# Altium footprint library Connector_PinHeader_2.54mm.PcbLib: 278 footprints (part 10 of 18) (continued)
## PinHeader_1x38_P2.54mm_Vertical_SMD_Pin1Right [mm] (continued)
  text "'.Designator'" at 0.84,-4.047 h1

## PinHeader_1x39_P2.54mm_Horizontal [mm]
pads (39):
  rect 1.7x1.7 hole 1: 1(0,0)
  rrect100% 1.7x1.7 hole 1: 2(0,-2.54) 3(0,-5.08) 4(0,-7.62) 5(0,-10.16) 6(0,-12.7) 7(0,-15.24) 8(0,-17.78) 9(0,-20.32) 10(0,-22.86) 11(0,-25.4) 12(0,-27.94) 13(0,-30.48) 14(0,-33.02) 15(0,-35.56) 16(0,-38.1) 17(0,-40.64) 18(0,-43.18) 19(0,-45.72) 20(0,-48.26) 21(0,-50.8) 22(0,-53.34) 23(0,-55.88) 24(0,-58.42) 25(0,-60.96) 26(0,-63.5) 27(0,-66.04) 28(0,-68.58) 29(0,-71.12) 30(0,-73.66) 31(0,-76.2) 32(0,-78.74) 33(0,-81.28) 34(0,-83.82) 35(0,-86.36) 36(0,-88.9) 37(0,-91.44) 38(0,-93.98) 39(0,-96.52)
F.SilkS:
  drawing of 245 lines, arcs and shapes, not listed
F.CrtYd:
  lines w0.05: -1.8,-98.3 -1.8,1.8 10.55,1.8 10.55,-98.3 -1.8,-98.3
F.Fab:
  drawing of 239 lines, arcs and shapes, not listed
  text "'.Designator'" at 3.61,-52.307 h1

## PinHeader_1x39_P2.54mm_Vertical [mm]
pads (39):
  rect 1.7x1.7 hole 1: 1(0,0)
  rrect100% 1.7x1.7 hole 1: 2(0,-2.54) 3(0,-5.08) 4(0,-7.62) 5(0,-10.16) 6(0,-12.7) 7(0,-15.24) 8(0,-17.78) 9(0,-20.32) 10(0,-22.86) 11(0,-25.4) 12(0,-27.94) 13(0,-30.48) 14(0,-33.02) 15(0,-35.56) 16(0,-38.1) 17(0,-40.64) 18(0,-43.18) 19(0,-45.72) 20(0,-48.26) 21(0,-50.8) 22(0,-53.34) 23(0,-55.88) 24(0,-58.42) 25(0,-60.96) 26(0,-63.5) 27(0,-66.04) 28(0,-68.58) 29(0,-71.12) 30(0,-73.66) 31(0,-76.2) 32(0,-78.74) 33(0,-81.28) 34(0,-83.82) 35(0,-86.36) 36(0,-88.9) 37(0,-91.44) 38(0,-93.98) 39(0,-96.52)
F.SilkS:
  lines w0.12: -1.33,0 -1.33,1.33 0,1.33 ; -1.33,-97.85 -1.33,-1.27 1.33,-1.27 1.33,-97.85 -1.33,-97.85
F.CrtYd:
  lines w0.05: -1.8,-98.3 1.8,-98.3 1.8,1.8 -1.8,1.8 -1.8,-98.3
F.Fab:
  lines w0.1: -1.27,-97.79 1.27,-97.79 1.27,1.27 -0.635,1.27 -1.27,0.635 -1.27,-97.79
  text "'.Designator'" at 0.84,-52.307 h1

## PinHeader_1x39_P2.54mm_Vertical_SMD_Pin1Left [mm]
pads (39):
  rect 2.51x1 smd: 1(-1.655,48.26) 2(1.655,45.72) 3(-1.655,43.18) 4(1.655,40.64) 5(-1.655,38.1) 6(1.655,35.56) 7(-1.655,33.02) 8(1.655,30.48) 9(-1.655,27.94) 10(1.655,25.4) 11(-1.655,22.86) 12(1.655,20.32) 13(-1.655,17.78) 14(1.655,15.24) 15(-1.655,12.7) 16(1.655,10.16) 17(-1.655,7.62) 18(1.655,5.08) 19(-1.655,2.54) 20(1.655,0) 21(-1.655,-2.54) 22(1.655,-5.08) 23(-1.655,-7.62) 24(1.655,-10.16) 25(-1.655,-12.7) 26(1.655,-15.24) 27(-1.655,-17.78) 28(1.655,-20.32) 29(-1.655,-22.86) 30(1.655,-25.4) 31(-1.655,-27.94) 32(1.655,-30.48) 33(-1.655,-33.02) 34(1.655,-35.56) 35(-1.655,-38.1) 36(1.655,-40.64) 37(-1.655,-43.18) 38(1.655,-45.72) 39(-1.655,-48.26)
F.SilkS:
  lines w0.12: -2.85,49.02 -1.33,49.02 -1.33,49.59 1.33,49.59 1.33,46.48 ; -1.33,-49.59 1.33,-49.59 ; -1.33,-47.5 -1.33,-43.94 ; -1.33,-42.42 -1.33,-38.86 ; -1.33,-37.34 -1.33,-33.78 ; -1.33,-32.26 -1.33,-28.7 ; -1.33,-27.18 -1.33,-23.62 ; -1.33,-22.1 -1.33,-18.54 ; -1.33,-17.02 -1.33,-13.46 ; -1.33,-11.94 -1.33,-8.38 ; -1.33,-6.86 -1.33,-3.3 ; -1.33,-1.78 -1.33,1.78 ; -1.33,3.3 -1.33,6.86 ; -1.33,8.38 -1.33,11.94 ; -1.33,13.46 -1.33,17.02 ; -1.33,18.54 -1.33,22.1 ; -1.33,23.62 -1.33,27.18 ; -1.33,28.7 -1.33,32.26 ; -1.33,33.78 -1.33,37.34 ; -1.33,38.86 -1.33,42.42 ; -1.33,43.94 -1.33,47.5 ; 1.33,-49.02 1.33,-49.59 ; 1.33,-46.48 1.33,-49.59 ; 1.33,-44.96 1.33,-41.4 ; 1.33,-39.88 1.33,-36.32 ; 1.33,-34.8 1.33,-31.24 ; 1.33,-29.72 1.33,-26.16 ; 1.33,-24.64 1.33,-21.08 ; 1.33,-19.56 1.33,-16 ; 1.33,-14.48 1.33,-10.92 ; 1.33,-9.4 1.33,-5.84 ; 1.33,-4.32 1.33,-0.76 ; 1.33,0.76 1.33,4.32 ; 1.33,5.84 1.33,9.4 ; 1.33,10.92 1.33,14.48 ; 1.33,16 1.33,19.56 ; 1.33,21.08 1.33,24.64 ; 1.33,26.16 1.33,29.72 ; 1.33,31.24 1.33,34.8 ; 1.33,36.32 1.33,39.88 ; 1.33,41.4 1.33,44.96
F.CrtYd:
  lines w0.05: -3.45,-50.05 3.45,-50.05 3.45,50.05 -3.45,50.05 -3.45,-50.05
F.Fab:
  lines w0.1: -1.27,-48.58 -2.54,-48.58 -2.54,-47.94 -1.27,-47.94 ; -1.27,-43.5 -2.54,-43.5 -2.54,-42.86 -1.27,-42.86 ; -1.27,-38.42 -2.54,-38.42 -2.54,-37.78 -1.27,-37.78 ; -1.27,-33.34 -2.54,-33.34 -2.54,-32.7 -1.27,-32.7 ; -1.27,-28.26 -2.54,-28.26 -2.54,-27.62 -1.27,-27.62 ; -1.27,-23.18 -2.54,-23.18 -2.54,-22.54 -1.27,-22.54 ; -1.27,-18.1 -2.54,-18.1 -2.54,-17.46 -1.27,-17.46 ; -1.27,-13.02 -2.54,-13.02 -2.54,-12.38 -1.27,-12.38 ; -1.27,-7.94 -2.54,-7.94 -2.54,-7.3 -1.27,-7.3 ; -1.27,-2.86 -2.54,-2.86 -2.54,-2.22 -1.27,-2.22 ; -1.27,2.22 -2.54,2.22 -2.54,2.86 -1.27,2.86 ; -1.27,7.3 -2.54,7.3 -2.54,7.94 -1.27,7.94 ; -1.27,12.38 -2.54,12.38 -2.54,13.02 -1.27,13.02 ; -1.27,17.46 -2.54,17.46 -2.54,18.1 -1.27,18.1 ; -1.27,22.54 -2.54,22.54 -2.54,23.18 -1.27,23.18 ; -1.27,27.62 -2.54,27.62 -2.54,28.26 -1.27,28.26 ; -1.27,32.7 -2.54,32.7 -2.54,33.34 -1.27,33.34 ; -1.27,37.78 -2.54,37.78 -2.54,38.42 -1.27,38.42 ; -1.27,42.86 -2.54,42.86 -2.54,43.5 -1.27,43.5 ; -1.27,47.94 -2.54,47.94 -2.54,48.58 -1.27,48.58 ; 1.27,-46.04 2.54,-46.04 2.54,-45.4 1.27,-45.4 ; 1.27,-40.96 2.54,-40.96 2.54,-40.32 1.27,-40.32 ; 1.27,-35.88 2.54,-35.88 2.54,-35.24 1.27,-35.24 ; 1.27,-30.8 2.54,-30.8 2.54,-30.16 1.27,-30.16 ; 1.27,-25.72 2.54,-25.72 2.54,-25.08 1.27,-25.08 ; 1.27,-20.64 2.54,-20.64 2.54,-20 1.27,-20 ; 1.27,-15.56 2.54,-15.56 2.54,-14.92 1.27,-14.92 ; 1.27,-10.48 2.54,-10.48 2.54,-9.84 1.27,-9.84 ; 1.27,-5.4 2.54,-5.4 2.54,-4.76 1.27,-4.76 ; 1.27,-0.32 2.54,-0.32 2.54,0.32 1.27,0.32 ; 1.27,4.76 2.54,4.76 2.54,5.4 1.27,5.4 ; 1.27,9.84 2.54,9.84 2.54,10.48 1.27,10.48 ; 1.27,14.92 2.54,14.92 2.54,15.56 1.27,15.56 ; 1.27,20 2.54,20 2.54,20.64 1.27,20.64 ; 1.27,25.08 2.54,25.08 2.54,25.72 1.27,25.72 ; 1.27,30.16 2.54,30.16 2.54,30.8 1.27,30.8 ; 1.27,35.24 2.54,35.24 2.54,35.88 1.27,35.88 ; 1.27,40.32 2.54,40.32 2.54,40.96 1.27,40.96 ; 1.27,45.4 2.54,45.4 2.54,46.04 1.27,46.04 ; -1.27,48.58 -0.32,49.53 1.27,49.53 1.27,-49.53 -1.27,-49.53 -1.27,48.58
  text "'.Designator'" at 0.84,-4.047 h1

## PinHeader_1x39_P2.54mm_Vertical_SMD_Pin1Right [mm]
pads (39):
  rect 2.51x1 smd: 1(1.655,48.26) 2(-1.655,45.72) 3(1.655,43.18) 4(-1.655,40.64) 5(1.655,38.1) 6(-1.655,35.56) 7(1.655,33.02) 8(-1.655,30.48) 9(1.655,27.94) 10(-1.655,25.4) 11(1.655,22.86) 12(-1.655,20.32) 13(1.655,17.78) 14(-1.655,15.24) 15(1.655,12.7) 16(-1.655,10.16) 17(1.655,7.62) 18(-1.655,5.08) 19(1.655,2.54) 20(-1.655,0) 21(1.655,-2.54) 22(-1.655,-5.08) 23(1.655,-7.62) 24(-1.655,-10.16) 25(1.655,-12.7) 26(-1.655,-15.24) 27(1.655,-17.78) 28(-1.655,-20.32) 29(1.655,-22.86) 30(-1.655,-25.4) 31(1.655,-27.94) 32(-1.655,-30.48) 33(1.655,-33.02) 34(-1.655,-35.56) 35(1.655,-38.1) 36(-1.655,-40.64) 37(1.655,-43.18) 38(-1.655,-45.72) 39(1.655,-48.26)
F.SilkS:
  lines w0.12: -1.33,-49.02 -1.33,-49.59 ; -1.33,-46.48 -1.33,-49.59 ; -1.33,-44.96 -1.33,-41.4 ; -1.33,-39.88 -1.33,-36.32 ; -1.33,-34.8 -1.33,-31.24 ; -1.33,-29.72 -1.33,-26.16 ; -1.33,-24.64 -1.33,-21.08 ; -1.33,-19.56 -1.33,-16 ; -1.33,-14.48 -1.33,-10.92 ; -1.33,-9.4 -1.33,-5.84 ; -1.33,-4.32 -1.33,-0.76 ; -1.33,0.76 -1.33,4.32 ; -1.33,5.84 -1.33,9.4 ; -1.33,10.92 -1.33,14.48 ; -1.33,16 -1.33,19.56 ; -1.33,21.08 -1.33,24.64 ; -1.33,26.16 -1.33,29.72 ; -1.33,31.24 -1.33,34.8 ; -1.33,36.32 -1.33,39.88 ; -1.33,41.4 -1.33,44.96 ; -1.33,46.48 -1.33,49.59 1.33,49.59 1.33,49.02 2.85,49.02 ; 1.33,-49.59 -1.33,-49.59 ; 1.33,-47.5 1.33,-43.94 ; 1.33,-42.42 1.33,-38.86 ; 1.33,-37.34 1.33,-33.78 ; 1.33,-32.26 1.33,-28.7 ; 1.33,-27.18 1.33,-23.62 ; 1.33,-22.1 1.33,-18.54 ; 1.33,-17.02 1.33,-13.46 ; 1.33,-11.94 1.33,-8.38 ; 1.33,-6.86 1.33,-3.3 ; 1.33,-1.78 1.33,1.78 ; 1.33,3.3 1.33,6.86 ; 1.33,8.38 1.33,11.94 ; 1.33,13.46 1.33,17.02 ; 1.33,18.54 1.33,22.1 ; 1.33,23.62 1.33,27.18 ; 1.33,28.7 1.33,32.26 ; 1.33,33.78 1.33,37.34 ; 1.33,38.86 1.33,42.42 ; 1.33,43.94 1.33,47.5
F.CrtYd:
  lines w0.05: -3.45,-50.05 -3.45,50.05 3.45,50.05 3.45,-50.05 -3.45,-50.05
F.Fab:
  lines w0.1: -1.27,-46.04 -2.54,-46.04 -2.54,-45.4 -1.27,-45.4 ; -1.27,-40.96 -2.54,-40.96 -2.54,-40.32 -1.27,-40.32 ; -1.27,-35.88 -2.54,-35.88 -2.54,-35.24 -1.27,-35.24 ; -1.27,-30.8 -2.54,-30.8 -2.54,-30.16 -1.27,-30.16 ; -1.27,-25.72 -2.54,-25.72 -2.54,-25.08 -1.27,-25.08 ; -1.27,-20.64 -2.54,-20.64 -2.54,-20 -1.27,-20 ; -1.27,-15.56 -2.54,-15.56 -2.54,-14.92 -1.27,-14.92 ; -1.27,-10.48 -2.54,-10.48 -2.54,-9.84 -1.27,-9.84 ; -1.27,-5.4 -2.54,-5.4 -2.54,-4.76 -1.27,-4.76 ; -1.27,-0.32 -2.54,-0.32 -2.54,0.32 -1.27,0.32 ; -1.27,4.76 -2.54,4.76 -2.54,5.4 -1.27,5.4 ; -1.27,9.84 -2.54,9.84 -2.54,10.48 -1.27,10.48 ; -1.27,14.92 -2.54,14.92 -2.54,15.56 -1.27,15.56 ; -1.27,20 -2.54,20 -2.54,20.64 -1.27,20.64 ; -1.27,25.08 -2.54,25.08 -2.54,25.72 -1.27,25.72 ; -1.27,30.16 -2.54,30.16 -2.54,30.8 -1.27,30.8 ; -1.27,35.24 -2.54,35.24 -2.54,35.88 -1.27,35.88 ; -1.27,40.32 -2.54,40.32 -2.54,40.96 -1.27,40.96 ; -1.27,45.4 -2.54,45.4 -2.54,46.04 -1.27,46.04 ; 1.27,-48.58 2.54,-48.58 2.54,-47.94 1.27,-47.94 ; 1.27,-43.5 2.54,-43.5 2.54,-42.86 1.27,-42.86 ; 1.27,-38.42 2.54,-38.42 2.54,-37.78 1.27,-37.78 ; 1.27,-33.34 2.54,-33.34 2.54,-32.7 1.27,-32.7 ; 1.27,-28.26 2.54,-28.26 2.54,-27.62 1.27,-27.62 ; 1.27,-23.18 2.54,-23.18 2.54,-22.54 1.27,-22.54 ; 1.27,-18.1 2.54,-18.1 2.54,-17.46 1.27,-17.46 ; 1.27,-13.02 2.54,-13.02 2.54,-12.38 1.27,-12.38 ; 1.27,-7.94 2.54,-7.94 2.54,-7.3 1.27,-7.3 ; 1.27,-2.86 2.54,-2.86 2.54,-2.22 1.27,-2.22 ; 1.27,2.22 2.54,2.22 2.54,2.86 1.27,2.86 ; 1.27,7.3 2.54,7.3 2.54,7.94 1.27,7.94 ; 1.27,12.38 2.54,12.38 2.54,13.02 1.27,13.02 ; 1.27,17.46 2.54,17.46 2.54,18.1 1.27,18.1 ; 1.27,22.54 2.54,22.54 2.54,23.18 1.27,23.18 ; 1.27,27.62 2.54,27.62 2.54,28.26 1.27,28.26 ; 1.27,32.7 2.54,32.7 2.54,33.34 1.27,33.34 ; 1.27,37.78 2.54,37.78 2.54,38.42 1.27,38.42 ; 1.27,42.86 2.54,42.86 2.54,43.5 1.27,43.5 ; 1.27,47.94 2.54,47.94 2.54,48.58 1.27,48.58 ; 1.27,48.58 0.32,49.53 -1.27,49.53 -1.27,-49.53 1.27,-49.53 1.27,48.58
  text "'.Designator'" at 0.84,-4.047 h1

## PinHeader_1x40_P2.54mm_Horizontal [mm]
pads (40):
  rect 1.7x1.7 hole 1: 1(0,0)
  rrect100% 1.7x1.7 hole 1: 2(0,-2.54) 3(0,-5.08) 4(0,-7.62) 5(0,-10.16) 6(0,-12.7) 7(0,-15.24) 8(0,-17.78) 9(0,-20.32) 10(0,-22.86) 11(0,-25.4) 12(0,-27.94) 13(0,-30.48) 14(0,-33.02) 15(0,-35.56) 16(0,-38.1) 17(0,-40.64) 18(0,-43.18) 19(0,-45.72) 20(0,-48.26) 21(0,-50.8) 22(0,-53.34) 23(0,-55.88) 24(0,-58.42) 25(0,-60.96) 26(0,-63.5) 27(0,-66.04) 28(0,-68.58) 29(0,-71.12) 30(0,-73.66) 31(0,-76.2) 32(0,-78.74) 33(0,-81.28) 34(0,-83.82) 35(0,-86.36) 36(0,-88.9) 37(0,-91.44) 38(0,-93.98) 39(0,-96.52) 40(0,-99.06)
F.SilkS:
  drawing of 251 lines, arcs and shapes, not listed
F.CrtYd:
  lines w0.05: -1.8,-100.85 -1.8,1.8 10.55,1.8 10.55,-100.85 -1.8,-100.85
F.Fab:
  drawing of 245 lines, arcs and shapes, not listed
  text "'.Designator'" at 3.61,-53.577 h1

## PinHeader_1x40_P2.54mm_Vertical [mm]
pads (40):
  rect 1.7x1.7 hole 1: 1(0,0)
  rrect100% 1.7x1.7 hole 1: 2(0,-2.54) 3(0,-5.08) 4(0,-7.62) 5(0,-10.16) 6(0,-12.7) 7(0,-15.24) 8(0,-17.78) 9(0,-20.32) 10(0,-22.86) 11(0,-25.4) 12(0,-27.94) 13(0,-30.48) 14(0,-33.02) 15(0,-35.56) 16(0,-38.1) 17(0,-40.64) 18(0,-43.18) 19(0,-45.72) 20(0,-48.26) 21(0,-50.8) 22(0,-53.34) 23(0,-55.88) 24(0,-58.42) 25(0,-60.96) 26(0,-63.5) 27(0,-66.04) 28(0,-68.58) 29(0,-71.12) 30(0,-73.66) 31(0,-76.2) 32(0,-78.74) 33(0,-81.28) 34(0,-83.82) 35(0,-86.36) 36(0,-88.9) 37(0,-91.44) 38(0,-93.98) 39(0,-96.52) 40(0,-99.06)
F.SilkS:
  lines w0.12: -1.33,0 -1.33,1.33 0,1.33 ; -1.33,-100.39 -1.33,-1.27 1.33,-1.27 1.33,-100.39 -1.33,-100.39
F.CrtYd:
  lines w0.05: -1.8,-100.85 -1.8,1.8 1.8,1.8 1.8,-100.85 -1.8,-100.85
F.Fab:
  lines w0.1: -1.27,-100.33 -1.27,0.635 -0.635,1.27 1.27,1.27 1.27,-100.33 -1.27,-100.33
  text "'.Designator'" at 0.84,-53.577 h1

## PinHeader_1x40_P2.54mm_Vertical_SMD_Pin1Left [mm]
pads (40):
  rect 2.51x1 smd: 1(-1.655,49.53) 2(1.655,46.99) 3(-1.655,44.45) 4(1.655,41.91) 5(-1.655,39.37) 6(1.655,36.83) 7(-1.655,34.29) 8(1.655,31.75) 9(-1.655,29.21) 10(1.655,26.67) 11(-1.655,24.13) 12(1.655,21.59) 13(-1.655,19.05) 14(1.655,16.51) 15(-1.655,13.97) 16(1.655,11.43) 17(-1.655,8.89) 18(1.655,6.35) 19(-1.655,3.81) 20(1.655,1.27) 21(-1.655,-1.27) 22(1.655,-3.81) 23(-1.655,-6.35) 24(1.655,-8.89) 25(-1.655,-11.43) 26(1.655,-13.97) 27(-1.655,-16.51) 28(1.655,-19.05) 29(-1.655,-21.59) 30(1.655,-24.13) 31(-1.655,-26.67) 32(1.655,-29.21) 33(-1.655,-31.75) 34(1.655,-34.29) 35(-1.655,-36.83) 36(1.655,-39.37) 37(-1.655,-41.91) 38(1.655,-44.45) 39(-1.655,-46.99) 40(1.655,-49.53)
F.SilkS:
  lines w0.12: -2.85,50.29 -1.33,50.29 -1.33,50.86 1.33,50.86 1.33,47.75 ; -1.33,-47.75 -1.33,-50.86 1.33,-50.86 1.33,-50.29 ; -1.33,-46.23 -1.33,-42.67 ; -1.33,-41.15 -1.33,-37.59 ; -1.33,-36.07 -1.33,-32.51 ; -1.33,-30.99 -1.33,-27.43 ; -1.33,-25.91 -1.33,-22.35 ; -1.33,-20.83 -1.33,-17.27 ; -1.33,-15.75 -1.33,-12.19 ; -1.33,-10.67 -1.33,-7.11 ; -1.33,-5.59 -1.33,-2.03 ; -1.33,-0.51 -1.33,3.05 ; -1.33,4.57 -1.33,8.13 ; -1.33,9.65 -1.33,13.21 ; -1.33,14.73 -1.33,18.29 ; -1.33,19.81 -1.33,23.37 ; -1.33,24.89 -1.33,28.45 ; -1.33,29.97 -1.33,33.53 ; -1.33,35.05 -1.33,38.61 ; -1.33,40.13 -1.33,43.69 ; -1.33,45.21 -1.33,48.77 ; 1.33,-48.77 1.33,-45.21 ; 1.33,-43.69 1.33,-40.13 ; 1.33,-38.61 1.33,-35.05 ; 1.33,-33.53 1.33,-29.97 ; 1.33,-28.45 1.33,-24.89 ; 1.33,-23.37 1.33,-19.81 ; 1.33,-18.29 1.33,-14.73 ; 1.33,-13.21 1.33,-9.65 ; 1.33,-8.13 1.33,-4.57 ; 1.33,-3.05 1.33,0.51 ; 1.33,2.03 1.33,5.59 ; 1.33,7.11 1.33,10.67 ; 1.33,12.19 1.33,15.75 ; 1.33,17.27 1.33,20.83 ; 1.33,22.35 1.33,25.91 ; 1.33,27.43 1.33,30.99 ; 1.33,32.51 1.33,36.07 ; 1.33,37.59 1.33,41.15 ; 1.33,42.67 1.33,46.23
F.CrtYd:
  lines w0.05: -3.45,-51.3 -3.45,51.3 3.45,51.3 3.45,-51.3 -3.45,-51.3
F.Fab:
  lines w0.1: -1.27,-47.31 -2.54,-47.31 -2.54,-46.67 -1.27,-46.67 ; -1.27,-42.23 -2.54,-42.23 -2.54,-41.59 -1.27,-41.59 ; -1.27,-37.15 -2.54,-37.15 -2.54,-36.51 -1.27,-36.51 ; -1.27,-32.07 -2.54,-32.07 -2.54,-31.43 -1.27,-31.43 ; -1.27,-26.99 -2.54,-26.99 -2.54,-26.35 -1.27,-26.35 ; -1.27,-21.91 -2.54,-21.91 -2.54,-21.27 -1.27,-21.27 ; -1.27,-16.83 -2.54,-16.83 -2.54,-16.19 -1.27,-16.19 ; -1.27,-11.75 -2.54,-11.75 -2.54,-11.11 -1.27,-11.11 ; -1.27,-6.67 -2.54,-6.67 -2.54,-6.03 -1.27,-6.03 ; -1.27,-1.59 -2.54,-1.59 -2.54,-0.95 -1.27,-0.95 ; -1.27,3.49 -2.54,3.49 -2.54,4.13 -1.27,4.13 ; -1.27,8.57 -2.54,8.57 -2.54,9.21 -1.27,9.21 ; -1.27,13.65 -2.54,13.65 -2.54,14.29 -1.27,14.29 ; -1.27,18.73 -2.54,18.73 -2.54,19.37 -1.27,19.37 ; -1.27,23.81 -2.54,23.81 -2.54,24.45 -1.27,24.45 ; -1.27,28.89 -2.54,28.89 -2.54,29.53 -1.27,29.53 ; -1.27,33.97 -2.54,33.97 -2.54,34.61 -1.27,34.61 ; -1.27,39.05 -2.54,39.05 -2.54,39.69 -1.27,39.69 ; -1.27,44.13 -2.54,44.13 -2.54,44.77 -1.27,44.77 ; -1.27,49.21 -2.54,49.21 -2.54,49.85 -1.27,49.85 ; 1.27,-49.85 2.54,-49.85 2.54,-49.21 1.27,-49.21 ; 1.27,-44.77 2.54,-44.77 2.54,-44.13 1.27,-44.13 ; 1.27,-39.69 2.54,-39.69 2.54,-39.05 1.27,-39.05 ; 1.27,-34.61 2.54,-34.61 2.54,-33.97 1.27,-33.97 ; 1.27,-29.53 2.54,-29.53 2.54,-28.89 1.27,-28.89 ; 1.27,-24.45 2.54,-24.45 2.54,-23.81 1.27,-23.81 ; 1.27,-19.37 2.54,-19.37 2.54,-18.73 1.27,-18.73 ; 1.27,-14.29 2.54,-14.29 2.54,-13.65 1.27,-13.65 ; 1.27,-9.21 2.54,-9.21 2.54,-8.57 1.27,-8.57 ; 1.27,-4.13 2.54,-4.13 2.54,-3.49 1.27,-3.49 ; 1.27,0.95 2.54,0.95 2.54,1.59 1.27,1.59 ; 1.27,6.03 2.54,6.03 2.54,6.67 1.27,6.67 ; 1.27,11.11 2.54,11.11 2.54,11.75 1.27,11.75 ; 1.27,16.19 2.54,16.19 2.54,16.83 1.27,16.83 ; 1.27,21.27 2.54,21.27 2.54,21.91 1.27,21.91 ; 1.27,26.35 2.54,26.35 2.54,26.99 1.27,26.99 ; 1.27,31.43 2.54,31.43 2.54,32.07 1.27,32.07 ; 1.27,36.51 2.54,36.51 2.54,37.15 1.27,37.15 ; 1.27,41.59 2.54,41.59 2.54,42.23 1.27,42.23 ; 1.27,46.67 2.54,46.67 2.54,47.31 1.27,47.31 ; -1.27,49.85 -1.27,-50.8 1.27,-50.8 1.27,50.8 -0.32,50.8 -1.27,49.85
  text "'.Designator'" at 0.84,-4.047 h1

## PinHeader_1x40_P2.54mm_Vertical_SMD_Pin1Right [mm]
pads (40):
  rect 2.51x1 smd: 1(1.655,49.53) 2(-1.655,46.99) 3(1.655,44.45) 4(-1.655,41.91) 5(1.655,39.37) 6(-1.655,36.83) 7(1.655,34.29) 8(-1.655,31.75) 9(1.655,29.21) 10(-1.655,26.67) 11(1.655,24.13) 12(-1.655,21.59) 13(1.655,19.05) 14(-1.655,16.51) 15(1.655,13.97) 16(-1.655,11.43) 17(1.655,8.89) 18(-1.655,6.35) 19(1.655,3.81) 20(-1.655,1.27) 21(1.655,-1.27) 22(-1.655,-3.81) 23(1.655,-6.35) 24(-1.655,-8.89) 25(1.655,-11.43) 26(-1.655,-13.97) 27(1.655,-16.51) 28(-1.655,-19.05) 29(1.655,-21.59) 30(-1.655,-24.13) 31(1.655,-26.67) 32(-1.655,-29.21) 33(1.655,-31.75) 34(-1.655,-34.29) 35(1.655,-36.83) 36(-1.655,-39.37) 37(1.655,-41.91) 38(-1.655,-44.45) 39(1.655,-46.99) 40(-1.655,-49.53)
F.SilkS:
  lines w0.12: -1.33,-50.29 -1.33,-50.86 1.33,-50.86 1.33,-47.75 ; -1.33,-48.77 -1.33,-45.21 ; -1.33,-43.69 -1.33,-40.13 ; -1.33,-38.61 -1.33,-35.05 ; -1.33,-33.53 -1.33,-29.97 ; -1.33,-28.45 -1.33,-24.89 ; -1.33,-23.37 -1.33,-19.81 ; -1.33,-18.29 -1.33,-14.73 ; -1.33,-13.21 -1.33,-9.65 ; -1.33,-8.13 -1.33,-4.57 ; -1.33,-3.05 -1.33,0.51 ; -1.33,2.03 -1.33,5.59 ; -1.33,7.11 -1.33,10.67 ; -1.33,12.19 -1.33,15.75 ; -1.33,17.27 -1.33,20.83 ; -1.33,22.35 -1.33,25.91 ; -1.33,27.43 -1.33,30.99 ; -1.33,32.51 -1.33,36.07 ; -1.33,37.59 -1.33,41.15 ; -1.33,42.67 -1.33,46.23 ; -1.33,47.75 -1.33,50.86 1.33,50.86 1.33,50.29 2.85,50.29 ; 1.33,-46.23 1.33,-42.67 ; 1.33,-41.15 1.33,-37.59 ; 1.33,-36.07 1.33,-32.51 ; 1.33,-30.99 1.33,-27.43 ; 1.33,-25.91 1.33,-22.35 ; 1.33,-20.83 1.33,-17.27 ; 1.33,-15.75 1.33,-12.19 ; 1.33,-10.67 1.33,-7.11 ; 1.33,-5.59 1.33,-2.03 ; 1.33,-0.51 1.33,3.05 ; 1.33,4.57 1.33,8.13 ; 1.33,9.65 1.33,13.21 ; 1.33,14.73 1.33,18.29 ; 1.33,19.81 1.33,23.37 ; 1.33,24.89 1.33,28.45 ; 1.33,29.97 1.33,33.53 ; 1.33,35.05 1.33,38.61 ; 1.33,40.13 1.33,43.69 ; 1.33,45.21 1.33,48.77
F.CrtYd:
  lines w0.05: -3.45,-51.3 -3.45,51.3 3.45,51.3 3.45,-51.3 -3.45,-51.3
F.Fab:
  lines w0.1: -1.27,-49.85 -2.54,-49.85 -2.54,-49.21 -1.27,-49.21 ; -1.27,-44.77 -2.54,-44.77 -2.54,-44.13 -1.27,-44.13 ; -1.27,-39.69 -2.54,-39.69 -2.54,-39.05 -1.27,-39.05 ; -1.27,-34.61 -2.54,-34.61 -2.54,-33.97 -1.27,-33.97 ; -1.27,-29.53 -2.54,-29.53 -2.54,-28.89 -1.27,-28.89 ; -1.27,-24.45 -2.54,-24.45 -2.54,-23.81 -1.27,-23.81 ; -1.27,-19.37 -2.54,-19.37 -2.54,-18.73 -1.27,-18.73 ; -1.27,-14.29 -2.54,-14.29 -2.54,-13.65 -1.27,-13.65 ; -1.27,-9.21 -2.54,-9.21 -2.54,-8.57 -1.27,-8.57 ; -1.27,-4.13 -2.54,-4.13 -2.54,-3.49 -1.27,-3.49 ; -1.27,0.95 -2.54,0.95 -2.54,1.59 -1.27,1.59 ; -1.27,6.03 -2.54,6.03 -2.54,6.67 -1.27,6.67 ; -1.27,11.11 -2.54,11.11 -2.54,11.75 -1.27,11.75 ; -1.27,16.19 -2.54,16.19 -2.54,16.83 -1.27,16.83 ; -1.27,21.27 -2.54,21.27 -2.54,21.91 -1.27,21.91 ; -1.27,26.35 -2.54,26.35 -2.54,26.99 -1.27,26.99 ; -1.27,31.43 -2.54,31.43 -2.54,32.07 -1.27,32.07 ; -1.27,36.51 -2.54,36.51 -2.54,37.15 -1.27,37.15 ; -1.27,41.59 -2.54,41.59 -2.54,42.23 -1.27,42.23 ; -1.27,46.67 -2.54,46.67 -2.54,47.31 -1.27,47.31 ; 1.27,-47.31 2.54,-47.31 2.54,-46.67 1.27,-46.67 ; 1.27,-42.23 2.54,-42.23 2.54,-41.59 1.27,-41.59 ; 1.27,-37.15 2.54,-37.15 2.54,-36.51 1.27,-36.51 ; 1.27,-32.07 2.54,-32.07 2.54,-31.43 1.27,-31.43 ; 1.27,-26.99 2.54,-26.99 2.54,-26.35 1.27,-26.35 ; 1.27,-21.91 2.54,-21.91 2.54,-21.27 1.27,-21.27 ; 1.27,-16.83 2.54,-16.83 2.54,-16.19 1.27,-16.19 ; 1.27,-11.75 2.54,-11.75 2.54,-11.11 1.27,-11.11 ; 1.27,-6.67 2.54,-6.67 2.54,-6.03 1.27,-6.03 ; 1.27,-1.59 2.54,-1.59 2.54,-0.95 1.27,-0.95 ; 1.27,3.49 2.54,3.49 2.54,4.13 1.27,4.13 ; 1.27,8.57 2.54,8.57 2.54,9.21 1.27,9.21 ; 1.27,13.65 2.54,13.65 2.54,14.29 1.27,14.29 ; 1.27,18.73 2.54,18.73 2.54,19.37 1.27,19.37 ; 1.27,23.81 2.54,23.81 2.54,24.45 1.27,24.45 ; 1.27,28.89 2.54,28.89 2.54,29.53 1.27,29.53 ; 1.27,33.97 2.54,33.97 2.54,34.61 1.27,34.61 ; 1.27,39.05 2.54,39.05 2.54,39.69 1.27,39.69 ; 1.27,44.13 2.54,44.13 2.54,44.77 1.27,44.77 ; 1.27,49.21 2.54,49.21 2.54,49.85 1.27,49.85 ; 1.27,49.85 0.32,50.8 -1.27,50.8 -1.27,-50.8 1.27,-50.8 1.27,49.85
  text "'.Designator'" at 0.84,-4.047 h1

## PinHeader_2x01_P2.54mm_Horizontal [mm]
pads (2):
  rect 1.7x1.7 hole 1: 1(0,0)
  rrect100% 1.7x1.7 hole 1: 2(2.54,0)
F.SilkS:
  lines w0.12: -1.27,0 -1.27,1.27 0,1.27 ; 1.11,-0.38 1.497,-0.38 ; 1.11,0.38 1.497,0.38 ; 3.583,-0.38 3.98,-0.38 ; 3.583,0.38 3.98,0.38 ; 6.64,-0.38 12.64,-0.38 12.64,0.38 6.64,0.38 ; 6.64,-0.28 12.64,-0.28 ; 6.64,-0.16 12.64,-0.16 ; 6.64,-0.04 12.64,-0.04 ; 6.64,0.08 12.64,0.08 ; 6.64,0.2 12.64,0.2 ; 6.64,0.32 12.64,0.32 ; 3.98,-1.33 6.64,-1.33 6.64,1.33 3.98,1.33 3.98,-1.33
F.CrtYd:
  lines w0.05: -1.8,-1.8 13.1,-1.8 13.1,1.8 -1.8,1.8 -1.8,-1.8
F.Fab:
  lines w0.1: 4.04,-0.32 -0.32,-0.32 -0.32,0.32 4.04,0.32 ; 6.58,-0.32 12.58,-0.32 12.58,0.32 6.58,0.32 ; 4.04,-1.27 6.58,-1.27 6.58,1.27 4.675,1.27 4.04,0.635 4.04,-1.27
  text "'.Designator'" at 6.15,-4.047 h1

## PinHeader_2x01_P2.54mm_Vertical [mm]
pads (2):
  rect 1.7x1.7 hole 1: 1(0,0)
  rrect100% 1.7x1.7 hole 1: 2(2.54,0)
F.SilkS:
  lines w0.12: -1.33,0 -1.33,1.33 0,1.33 ; -1.33,-1.33 -1.33,-1.27 1.27,-1.27 1.27,1.33 3.87,1.33 3.87,-1.33 -1.33,-1.33
F.CrtYd:
  lines w0.05: -1.8,-1.8 4.35,-1.8 4.35,1.8 -1.8,1.8 -1.8,-1.8
F.Fab:
  lines w0.1: -1.27,-1.27 3.81,-1.27 3.81,1.27 0,1.27 -1.27,0 -1.27,-1.27
  text "'.Designator'" at 2.11,-4.047 h1